# Altium schematic symbol library Connectors.SchLib: 83 symbols (continued)
## 5022442430 (continued)
CONN 24x1 FFC 0.5mm bottom SMT; Manufacturer: Molex; Number of Contacts: 24; Max Voltage Rating (AC): 50V; Current Rating: 400mA; Stackable: No; Wire/Cable Type: Straight,Flat Flex; Mating Cycles: 20; Supplier 1: Digi-Key; Manufacturer Part Number: 5022442430; Category: FFC / FPC; Stock 1: 13141; Pricing 1: 1=1.52000, 10=1.37600, 25=1.29160, 50=1.23540, 100=1.17930, 250=1.06696, 500=0.98272, 1000=0.84233 (USD); Min Operating Temperature: -25°C; Max Operating Temperature: 85°C; Orientation: Right Angle; Number of Rows: 1; Number of Positions: 24; Voltage Rating: 50V; Number of Circuits: 24; Contact Location: Bottom; Max Voltage Rating (DC): 50V; Voltage Rating (AC): 50V; Pitch: 0.5mm; ComponentLink1URL: https://datasheet.ciiva.com/673/5022441530-sd-673746.pdf?src-supplier=Digi-Key; ComponentLink1Description: https://datasheet.ciiva.com/673/5022441530-sd-673746.pdf?src-supplier=Digi-Key; Supplier Part Number 1: WM14450CT-ND
footprint MOLX-502244-2430 (FFC Connector, 24-Leads, Right Angle, Pitch 0.5 mm, Mated Height 2.33 mm, SMT)
pins: 1, 2, 3, 4, 5, 6, 7, 8, 9, 10, 11, 12, 13, 14, 15, 16, 17, 18, 19, 20, 21, 22, 23, 24, MP1, MP2, MP3, MP4

## 5031482090
designator J?
CONN RCPT 20P 0.059 TIN SMD R/A; Manufacturer: Molex; Number of Contacts: 20; Pitch: 1.5mm; Manufacturer Part Number: 5031482090; Min Operating Temperature: -55°C; Max Operating Temperature: 125°C; Number of Rows: 2; Mounting Type: Surface Mount, Right Angle; ComponentLink1URL: https://datasheet.ciiva.com/22665/shf-22665879.pdf?src-supplier=Element14; ComponentLink1Description: https://datasheet.ciiva.com/22665/shf-22665879.pdf?src-supplier=Element14; Supplier 1: Digi-Key; Supplier Part Number 1: WM9451CT-ND
pins: 1, 2, 3, 4, 5, 6, 7, 8, 9, 10, 11, 12, 13, 14, 15, 16, 17, 18, 19, 20, EP, EP

## 5034800600
designator J?
CONN 6x1 FFC 0.5mm top SMT; Manufacturer: Molex; Manufacturer Part Number: 503480-0600; Current Rating: 500mA; Voltage Rating: 50V; Number of Positions: 6; Wire/Cable Type: Straight; Stackable: No; Mating Cycles: 10; Supplier 1: Digi-Key; Category: FFC / FPC; Stock 1: 25597; Pricing 1: 1=0.74000, 10=0.64900, 25=0.61080, 50=0.58540, 100=0.56000, 250=0.50908, 500=0.45818, 1000=0.40726 (USD); Min Operating Temperature: -40°C; Max Operating Temperature: 85°C; Number of Rows: 1; Orientation: Right Angle; Number of Contacts: 6; Max Voltage Rating (AC): 50V; Max Voltage Rating (DC): 50V; Voltage Rating (AC): 50V; Number of Circuits: 6; Pitch: 0.5mm; ComponentLink1URL: https://datasheet.ciiva.com/671/5034800400-sd-671136.pdf?src-supplier=Digi-Key; ComponentLink1Description: https://datasheet.ciiva.com/671/5034800400-sd-671136.pdf?src-supplier=Digi-Key; Supplier Part Number 1: WM1387CT-ND
footprint MOLX-503480-0600 (FPC Connector, 6-Leads, Right Angle, Pitch 0.5 mm, Mated Height 1.0 mm, SMT)
pins: 1, 2, 3, 4, 5, 6, MP1, MP2

## 68610614122
designator J?
CONN 6x1 FFC 1.0mm top SMT; Manufacturer: Wurth Electronics; Number of Positions: 6; Current Rating: 1A; Voltage Rating: 125V; Pitch: 0.039inch; Supplier 1: Digi-Key; Manufacturer Part Number: 68610614122; Category: FFC / FPC; Stock 1: 5066; Pricing 1: 1=0.78000, 10=0.72100, 50=0.67000, 100=0.58000, 500=0.55400 (USD); Min Operating Temperature: -25°C; Max Operating Temperature: 85°C; Orientation: Straight; Number of Rows: 1; Number of Contacts: 6; ComponentLink1URL: https://datasheet.ciiva.com/25617/0900766b81113a8e-25617748.pdf?src-supplier=RSComponents; ComponentLink1Description: https://datasheet.ciiva.com/25617/0900766b81113a8e-25617748.pdf?src-supplier=RSComponents; Supplier Part Number 1: 732-2002-1-ND
footprint 68610614122 (ZIF Connectors, Horizontal, Top Contact, pitch 1mm, 6p)
pins: 1, 2, 3, 4, 5, 6, MP1, MP2

## 68610614122 Orientation reversed
designator J?
CONN 6x1 FFC 1.0mm top SMT orientation reversed; Manufacturer: Wurth Electronics; Number of Positions: 6; Current Rating: 1A; Voltage Rating: 125V; Pitch: 0.039inch; Supplier 1: Digi-Key; Manufacturer Part Number: 68610614122; Category: FFC / FPC; Min Operating Temperature: -25°C; Max Operating Temperature: 85°C; Orientation: Pinout reversed from drawing; Number of Rows: 1; Number of Contacts: 6; ComponentLink1URL: https://datasheet.ciiva.com/25617/0900766b81113a8e-25617748.pdf?src-supplier=RSComponents; ComponentLink1Description: https://datasheet.ciiva.com/25617/0900766b81113a8e-25617748.pdf?src-supplier=RSComponents; Supplier Part Number 1: 732-2002-1-ND
footprint 68610614122 orientation reversed (ZIF Connectors, Horizontal, Top Contact, pitch 1mm, 6p)
pins: 1, 2, 3, 4, 5, 6, MP1, MP2

## B2B-PH-K-S(LF)(SN)
designator J?
CONN 2x1 VERT keyed 2mm TH; Manufacturer: JST; Manufacturer Part Number: B2BPHKSLFSN; Number of Positions: 2; Max Voltage Rating (AC): 100V; Max Current Rating: 2A; Category: Connectors; Min Operating Temperature: -25°C; Max Operating Temperature: 85°C; Orientation: Straight; Fastening Type: Detent; Number of Contacts: 2; Working Voltage: 100V; Max Voltage Rating (DC): 100V; Number of Rows: 1; Number of Poles: 2; Current Rating: 2A; Voltage Rating: 100V; Voltage Rating (AC): 100V; Height: 9.4mm; Pitch: 2mm; Lead Pitch: 2mm; ComponentLink1URL: https://datasheet.ciiva.com/6747/80560-6747392.pdf?src-supplier=Newark; ComponentLink1Description: https://datasheet.ciiva.com/6747/80560-6747392.pdf?src-supplier=Newark; Supplier 1: Digi-Key; Supplier Part Number 1: 455-1704-ND; Supplier 2: RSComponents; Supplier Part Number 2: 8201422; Supplier 3: Future Electronics; Supplier Part Number 3: 6306179; Supplier 4: Newark; Supplier Part Number 4: 37K9940
footprint JST-B2B-PH-K-S_V (Connector, 2-Leads, Body 5.9x4.5mm, Pitch 2mm)
pins: 1 ?, 2 ?

## B4B-PH-K-S(LF)(SN)
designator J?
CONN 4x1 VERT keyed 2mm TH; Manufacturer: JST; Current Rating: 2A; Number of Contacts: 4; Max Voltage Rating (AC): 100V; Manufacturer Part Number: B4B-PH-K-S(LF)(SN); Category: Connectors; Stock 1: 30936; Pricing 1: 1=0.24000, 10=0.22700, 100=0.15730, 500=0.13312, 1000=0.10892, 5000=0.09682, 10000=0.08774 (USD); Min Operating Temperature: -25°C; Max Operating Temperature: 85°C; Fastening Type: Detent; Max Voltage Rating (DC): 100V; Working Voltage: 100V; Orientation: Straight; Number of Rows: 1; Voltage Rating: 100V; Max Current Rating: 2A; Number of Poles: 4; Voltage Rating (AC): 100V; Number of Positions: 4; Height: 9.4mm; Pitch: 2mm; Lead Pitch: 2mm; ComponentLink1URL: https://datasheet.ciiva.com/11747/0900766b8082f552-11747200.pdf?src-supplier=RSComponents; ComponentLink1Description: https://datasheet.ciiva.com/11747/0900766b8082f552-11747200.pdf?src-supplier=RSComponents; Supplier 1: Digi-Key; Supplier Part Number 1: 455-1706-ND; Supplier 2: Farnell; Supplier Part Number 2: 9492437; Supplier 3: RSComponents; Supplier Part Number 3: 8201434
footprint JST_B4B-PH-K-S(LF)(SN)
pins: 1 ?, 2 ?, 3 ?, 4 ?

## B4B-PH-SM4-TBT(LF)(SN)
designator J?
CONN HEADER SMD 4POS 2MM; Manufacturer: JST; Current Rating: 2A; Number of Poles: 4; Voltage Rating: 100V; Manufacturer Part Number: B4B-PH-SM4-TBT(LF)(SN); Colour: White,Natural; Housing Colour: Natural; Min Operating Temperature: -25°C; Max Operating Temperature: 85°C; Number of Rows: 1; Number of Positions: 4; Orientation: Right Angle; Height: 8.6mm; Pitch: 2mm; ComponentLink1URL: https://datasheet.ciiva.com/11747/0900766b8082653c-11747869.pdf; ComponentLink1Description: https://datasheet.ciiva.com/11747/0900766b8082653c-11747869.pdf; Supplier 1: Digi-Key; Supplier Part Number 1: 455-2873-1-ND
footprint B4B-PH-SM4-TBT(LF)(SN)
pins: 0 ?, 1 ?, 2 ?, 3 ?, 4 ?

## CONN 2 M20-9990245
designator J?, comment M20-9990245
CONN HEADER 2x1 pin 0.1" TH; Manufacturer: Harwin Inc.; Pitch - Mating: 0.100" (2.54mm); Number of Positions: 2; Number of Positions Loaded: All; Style: Board to Board or Cable; Shrouding: Unshrouded; Contact Length - Mating: 0.240" (6.10mm); Contact Length - Post: 0.118" (3.00mm); Overall Contact Length: 0.460" (11.68mm); Material Flammability Rating: UL94 V-0; Current Rating: 3A per Contact; Mated Stacking Heights: 10.04mm, 10.64mm, 11.04mm, 16.54mm; Supplier 1: Digi-Key; Manufacturer Part Number: M20-9990245; Category: Connectors, Interconnects; Stock 1: 32617; Pricing 1: 1=0.15, 10=0.136, 100=0.0841, 500=0.0696, 1000=0.0609, 5000=0.0522, 10000=0.05075 (USD); Contact Type: Male Pin; Number of Rows: 1; Mounting Type: Through Hole; Fastening Type: Push-Pull; Insulation Height: 0.100" (2.54mm); Contact Finish - Mating: Gold; Features: -; Operating Temperature: -40°C ~ 105°C; Insulation Color: Black; Voltage Rating: -; Applications: -; ComponentLink1URL: https://cdn.harwin.com/pdfs/M20-999.pdf; ComponentLink1Description: https://cdn.harwin.com/pdfs/M20-999.pdf; Supplier Part Number 1: 952-2261-ND
footprint CONN 0.1" SIL 2
pins: 1 ?, 2 ?

## CONN 3 M20-9990345
designator J?, comment M20-9990345
CONN HEADER 3x1 pin 0.1 TH; Manufacturer: Harwin Inc.; Pitch - Mating: 0.100" (2.54mm); Number of Positions: 3; Number of Positions Loaded: All; Style: Board to Board or Cable; Shrouding: Unshrouded; Contact Length - Mating: 0.240" (6.10mm); Contact Length - Post: 0.118" (3.00mm); Overall Contact Length: 0.460" (11.68mm); Material Flammability Rating: UL94 V-0; Current Rating: 3A per Contact; Mated Stacking Heights: 10.04mm, 10.64mm, 11.04mm, 16.54mm; Supplier 1: Digi-Key; Manufacturer Part Number: M20-9990345; Category: Connectors, Interconnects; Stock 1: 68489; Pricing 1: 1=0.18, 10=0.165, 100=0.1015, 500=0.084, 1000=0.0735, 5000=0.063, 10000=0.06125 (USD); Contact Type: Male Pin; Number of Rows: 1; Mounting Type: Through Hole; Fastening Type: Push-Pull; Insulation Height: 0.100" (2.54mm); Contact Finish - Mating: Gold; Features: -; Operating Temperature: -40°C ~ 105°C; Insulation Color: Black; Voltage Rating: -; Applications: -; ComponentLink1URL: https://cdn.harwin.com/pdfs/M20-999.pdf; ComponentLink1Description: https://cdn.harwin.com/pdfs/M20-999.pdf; Supplier Part Number 1: 952-2263-ND
footprint CONN 0.1" SIL 3
pins: 1 ?, 2 ?, 3 ?

## CONN 4 M20-9990445
designator J?, comment M20-9990445
CONN HEADER 4x1 pin 0.1 TH; Manufacturer: Harwin; Number of Contacts: 4; Current Rating: 3A; Pitch: 2.54mm; ComponentLink1URL: https://cdn.harwin.com/pdfs/M20-999.pdf; ComponentLink1Description: https://cdn.harwin.com/pdfs/M20-999.pdf; Supplier 1: Digi-Key; Manufacturer Part Number: M20-9990445; Category: Headers and Wire Housings; Stock 1: 7974; Pricing 1: 1=0.19000, 10=0.18000, 100=0.12480, 500=0.10560, 1000=0.08640, 5000=0.07680, 10000=0.06960 (USD); Case/Package: SIL; Min Operating Temperature: -40°C; Max Operating Temperature: 105°C; Number of Rows: 1; Orientation: Straight; Number of Positions: 4; Max Current Rating: 3A; Height: 0.1inch; Supplier Part Number 1: 952-2265-ND
footprint CONN 0.1" SIL 4
pins: 1 ?, 2 ?, 3 ?, 4 ?

## CONUFL001-SMD-T
designator J?
CONN UMC JACK STR SMD; Manufacturer: Linx; Connector Style: U.FL (UMCC); Connector Type: Jack, Male Pin; Impedance: 50 Ohm; Manufacturer Part Number: CONUFL001-SMD-T; Fastening Type: Snap-On; Supplier 1: Digi-Key; Supplier Part Number 1: CONUFL001-SMD-TCT-ND
footprint U.FL connector
pins: 1 ?, 2 ?, 2 ?

## CUI_TB010-508-05BE
designator J?, comment TB010-508-05BE
5 Position Wire to Board, Board 0.200" (5.08mm); Manufacturer: CUI; Manufacturer Part Number: TB010-508-05BE; Supplier 1: Digi-Key; Supplier Part Number 1: 102-6221-ND
footprint CUI_TB010-508-05BE
pins: 1, 2, 3, 4, 5

## FH12-40S-0.5SH(55)
designator J?
CONN 40x1 FFC 0.5mm bottom SMT; Manufacturer: Hirose; Manufacturer Part Number: FH12A-40S-0.5SH(55); Voltage Rating: 50V; Current Rating: 500mA; Number of Positions: 40; Mating Cycles: 20; Wire/Cable Type: Straight; Contact Location: Top; Max Current Rating: 400mA; Supplier 1: Digi-Key; Category: FFC / FPC; Stock 1: 6676; Pricing 1: 1=2.56000, 10=2.45500, 25=2.25080, 50=2.14840, 100=2.04600, 250=1.79024, 500=1.73910 (USD); Min Operating Temperature: -40°C; Max Operating Temperature: 70°C; Number of Rows: 1; Orientation: Right Angle; Number of Contacts: 40; Max Voltage Rating (AC): 50V; Voltage Rating (AC): 50V; Pitch: 0.5mm; Lead Pitch: 0.5mm; ComponentLink1URL: https://datasheet.ciiva.com/14667/0900766b80806912-14667338.pdf?src-supplier=RSComponents; ComponentLink1Description: https://datasheet.ciiva.com/14667/0900766b80806912-14667338.pdf?src-supplier=RSComponents; Supplier Part Number 1: HFK140CT-ND
footprint HIRO-FH12A-40S-0.5SH(55)_V (SMD, 40-Leads, Body 24.5x6.2mm, Pitch 0.5mm)
pins: 1, 2, 3, 4, 5, 6, 7, 8, 9, 10, 11, 12, 13, 14, 15, 16, 17, 18, 19, 20, 21, 22, 23, 24, 25, 26, 27, 28, 29, 30, 31, 32, 33, 34, 35, 36, 37, 38, 39, 40, MP1, MP2

## FTSH-110-01-L-DV
designator J?
CONN HEADER SMD 20POS 1.27MM; Manufacturer: Samtec; Number of Positions: 20; Current Rating: 3.4A; Shrouded: No; Manufacturer Part Number: FTSH-110-01-L-DV; Connector Type: Header; Min Operating Temperature: -55°C; Max Operating Temperature: 125°C; Number of Rows: 2; Orientation: Vertical; ComponentLink1URL: https://datasheet.ciiva.com/714/eng-cd-103308-m-714897.pdf?src-supplier=Digi-Key; ComponentLink1Description: https://datasheet.ciiva.com/714/eng-cd-103308-m-714897.pdf?src-supplier=Digi-Key; Supplier 1: Digi-Key; Supplier Part Number 1: SAM1161-10-ND; Supplier 2: Newark; Supplier Part Number 2: 11P4829; Pitch: 1.27mm
footprint FTSH-110-01-L-DV
pins: 1, 2, 3, 4, 5, 6, 7, 8, 9, 10, 11, 12, 13, 14, 15, 16, 17, 18, 19, 20

## FX22-50P-0.5SH
designator J?
CONN PLUG 50x1 RA 0.5MM SMD; Manufacturer: Hirose; Number of Positions: 50; Pitch: 0.02inch; Supplier 1: Digi-Key; Manufacturer Part Number: FX22-50P-0.5SH; Category: Headers and Wire Housings; Stock 1: 234; Pricing 1: 1=2.97000, 10=2.85100, 25=2.61360, 50=2.49480, 100=2.37600, 250=2.07900 (USD); Number of Rows: 1; ComponentLink1URL: https://www.hirose.com/product/en/download_file/key_name/FX22/category/Catalog/doc_file_id/49374/?file_category_id=4&item_id=205&is_series=1&src-supplier=Digi-Key; ComponentLink1Description: https://www.hirose.com/product/en/download_file/key_name/FX22/category/Catalog/doc_file_id/49374/?file_category_id=4&item_id=205&is_series=1&src-supplier=Digi-Key; Supplier Part Number 1: H122984CT-ND
footprint FX22-50P-0.5SH
pins: 1, 2, 3, 4, 5, 6, 7, 8, 9, 10, 11, 12, 13, 14, 15, 16, 17, 18, 19, 20, 21, 22, 23, 24, 25, 26, 27, 28, 29, 30, 31, 32, 33, 34, 35, 36, 37, 38, 39, 40, 41, 42, 43, 44, 45, 46, 47, 48, 49, 50, MH1, MH2, MH3, MH4

## FX22-50S-0.5SH
designator J?
CONN RCPT 50x1 RA 0.5MM SMD; Manufacturer: Hirose; Number of Positions: 50; Pitch: 0.02inch; Supplier 1: Digi-Key; Manufacturer Part Number: FX22-50S-0.5SH; Category: Headers and Wire Housings; Stock 1: 685; Pricing 1: 1=2.61000, 10=2.50800, 25=2.29920, 50=2.19460, 100=2.09000, 250=1.82876 (USD); Number of Rows: 1; ComponentLink1URL: https://www.hirose.com/product/en/download_file/key_name/FX22/category/Catalog/doc_file_id/49374/?file_category_id=4&item_id=205&is_series=1&src-supplier=Digi-Key; ComponentLink1Description: https://www.hirose.com/product/en/download_file/key_name/FX22/category/Catalog/doc_file_id/49374/?file_category_id=4&item_id=205&is_series=1&src-supplier=Digi-Key; Supplier Part Number 1: H122988CT-ND
footprint FX22-50S-0.5SH
pins: 1, 2, 3, 4, 5, 6, 7, 8, 9, 10, 11, 12, 13, 14, 15, 16, 17, 18, 19, 20, 21, 22, 23, 24, 25, 26, 27, 28, 29, 30, 31, 32, 33, 34, 35, 36, 37, 38, 39, 40, 41, 42, 43, 44, 45, 46, 47, 48, 49, 50, MH1, MH2, MH3, MH4

## KEYSTONE_7693
designator J?, comment Keystone 7693
CONN TERM screw block 15A TH; Manufacturer: Keystone Electronics; Manufacturer Part Number: 7693; Number of Contacts: 4; Supplier 1: Digi-Key; Supplier Part Number 1: 36-7693-ND; Stock 1: 79261; Pricing 1: 1=0.57, 10=0.535, 50=0.428, 100=0.4101, 250=0.37444, 500=0.3566, 1000=0.2995, 2500=0.26745, 5000=0.25854 (USD); Colour: Silver; Current Rating: 15A; Orientation: Vertical; Number of Rows: 2; Diameter: 0.31inch; Height: 0.44inch; ComponentLink1URL: https://datasheet.ciiva.com/14550/70181561-14550853.pdf; ComponentLink1Description: https://datasheet.ciiva.com/14550/70181561-14550853.pdf
footprint DIP6_C258H193_KEYSTONE_7693
pins: 1, 2, 3, 4

## MOLEX_0475890001
designator J?
CONN USB AB female micro TH; Manufacturer: Molex; Number of Contacts: 5; Number of Ports: 1; Max Voltage Rating (AC): 100V; Pitch: 0.65mm; Manufacturer Part Number: 0475890001; Stock 1: 33278; Pricing 1: 1=0.74, 10=0.649, 25=0.6108, 50=0.5854, 100=0.56, 250=0.5091, 500=0.4582 (USD); Number of Terminals: 5; Min Operating Temperature: -20°C; Max Operating Temperature: 85°C; Orientation: Right Angle; ComponentLink1URL: https://datasheet.ciiva.com/15181/getdatasheetpartid-247969-15181267.pdf; ComponentLink1Description: https://datasheet.ciiva.com/15181/getdatasheetpartid-247969-15181267.pdf; Supplier 1: Mouser; Supplier Part Number 1: 538-47589-0001; Supplier 2: Newark; Supplier Part Number 2: 40P3749
footprint MOLX-47589-0001_V (SMD, 5-Leads, Body 7.5x5.6mm, Pitch 0.65mm)
pins: 1 VCC, 2 D-, 3 D+, 4 ID, 5 GND, PAD, TH TH SHLD

## PPPC061LFBN-RC
designator J?
CONN HEADER 6x1 female 0.1" TH; Manufacturer: Sullins; Number of Positions: 6; Pitch: 0.1inch; Supplier 1: Digi-Key; Manufacturer Part Number: PPPC061LFBN-RC; Category: Connectors; Stock 1: 21128; Pricing 1: 1=0.53000, 10=0.50000, 100=0.38300, 500=0.33300, 1000=0.27473, 5000=0.24143, 10000=0.24050 (USD); Number of Rows: 1; Height: 8.5mm; ComponentLink1URL: https://media.digikey.com/pdf/Data%20Sheets/Sullins%20PDFs/Female_Headers.100_DS.pdf?src-supplier=Digi-Key; ComponentLink1Description: https://media.digikey.com/pdf/Data%20Sheets/Sullins%20PDFs/Female_Headers.100_DS.pdf?src-supplier=Digi-Key; Supplier Part Number 1: S7039-ND
footprint SLIN-PPPC061LFBN-RC_V (THD, 6-Leads)
pins: 1, 2, 3, 4, 5, 6

## PPPC081LFBN-RC
designator J?
CONN HEADER 8x1 female 0.1" TH; Manufacturer: Sullins; Number of Positions: 8; Pitch: 0.1inch; Supplier 1: Digi-Key; Manufacturer Part Number: PPPC081LFBN-RC; Category: Connectors; Stock 1: 30815; Pricing 1: 1=0.67000, 10=0.63200, 100=0.48440, 500=0.42120, 1000=0.34749, 5000=0.30537, 10000=0.30420 (USD); Number of Rows: 1; Height: 8.5mm; ComponentLink1URL: https://media.digikey.com/pdf/Data%20Sheets/Sullins%20PDFs/Female_Headers.100_DS.pdf?src-supplier=Digi-Key; ComponentLink1Description: https://media.digikey.com/pdf/Data%20Sheets/Sullins%20PDFs/Female_Headers.100_DS.pdf?src-supplier=Digi-Key; Supplier Part Number 1: S7041-ND
footprint SLIN-PPPC081LFBN-RC_V (THD, 8-Leads, Body 20.82x2.54mm, Pitch 2.54mm)
pins: 1, 2, 3, 4, 5, 6, 7, 8

## PPPC101LFBN-RC
designator J?
CONN HEADER 10x1 female 0.1" TH; Manufacturer: Sullins; Number of Positions: 10; Pitch: 0.1inch; Supplier 1: Digi-Key; Manufacturer Part Number: PPPC101LFBN-RC; Category: Connectors; Stock 1: 21587; Pricing 1: 1=0.68000, 10=0.59400, 100=0.51280, 500=0.41958, 1000=0.37296, 5000=0.33670 (USD); Number of Rows: 1; Height: 8.5mm; ComponentLink1URL: https://media.digikey.com/pdf/Data%20Sheets/Sullins%20PDFs/Female_Headers.100_DS.pdf?src-supplier=Digi-Key; ComponentLink1Description: https://media.digikey.com/pdf/Data%20Sheets/Sullins%20PDFs/Female_Headers.100_DS.pdf?src-supplier=Digi-Key; Supplier Part Number 1: S7043-ND
footprint SLIN-PPPC101LFBN-RC_V (THD, 10-Leads)
pins: 1, 2, 3, 4, 5, 6, 7, 8, 9, 10

## PPPC142LFBN-RC
designator J?  Supplier Part Number 1: S7117-ND
CONN HDR 28POS 0.1 GOLD PCB; Manufacturer: Sullins; Number of Positions: 28; Pitch: 0.1inch; Manufacturer Part Number: PPPC142LFBN-RC; Category: Connectors; Stock 1: 1723; Number of Rows: 2; Height: 8.5mm; ComponentLink1URL: https://media.digikey.com/pdf/Data%20Sheets/Sullins%20PDFs/Female_Headers.100_DS.pdf?src-supplier=Digi-Key; ComponentLink1Description: https://media.digikey.com/pdf/Data%20Sheets/Sullins%20PDFs/Female_Headers.100_DS.pdf?src-supplier=Digi-Key; Supplier 1: Digi-Key
footprint PPPC142LFBN-RC (THD, 28-Leads)
pins: 1, 2, 3, 4, 5, 6, 7, 8, 9, 10, 11, 12, 13, 14, 15, 16, 17, 18, 19, 20, 21, 22, 23, 24, 25, 26, 27, 28

## PPPC162LFBN-RC
designator J?  Supplier Part Number 1: S7119-ND
CONN HDR 32POS 0.1 GOLD PCB; Manufacturer: Sullins; Number of Positions: 32; Pitch: 0.1inch; Manufacturer Part Number: PPPC162LFBN-RC; Category: Connectors; Stock 1: 1273; Number of Rows: 2; Height: 8.5mm; ComponentLink1URL: https://media.digikey.com/pdf/Data%20Sheets/Sullins%20PDFs/Female_Headers.100_DS.pdf?src-supplier=Digi-Key; ComponentLink1Description: https://media.digikey.com/pdf/Data%20Sheets/Sullins%20PDFs/Female_Headers.100_DS.pdf?src-supplier=Digi-Key; Supplier 1: Digi-Key
footprint PPPC162LFBN-RC (THD, 32-Leads)
pins: 1, 2, 3, 4, 5, 6, 7, 8, 9, 10, 11, 12, 13, 14, 15, 16, 17, 18, 19, 20, 21, 22, 23, 24, 25, 26, 27, 28, 29, 30, 31, 32

## PR20206VBNN
designator J?
CONN HEADER 6x1 male 0.1" TH; Manufacturer: METZ CONNECT; Number of Positions: 6; Pitch: 0.1inch; Manufacturer Part Number: PR20206VBNN; Category: Connectors; Stock 1: 21128; Pricing 1: 1=0.53000, 10=0.50000, 100=0.38300, 500=0.33300, 1000=0.27473, 5000=0.24143, 10000=0.24050 (USD); Number of Rows: 1; Height: 8.5mm; Supplier 1: Digi-Key; Supplier Part Number 1: 1849-PR20206VBNN-ND
footprint PR20206VBNN (THD, 6-Leads)
pins: 1, 2, 3, 4, 5, 6

## PREC016DAAN-RC
designator J?
CONN HEADER VERT 32POS 2.54MM; Manufacturer: Sullins; Manufacturer Part Number: S2012EC-16-ND; Number of Positions: 32; Pitch: 0.1inch; Category: Connectors; Number of Rows: 2; ComponentLink1URL: https://media.digikey.com/pdf/Data%20Sheets/Sullins%20PDFs/Female_Headers.100_DS.pdf?src-supplier=Digi-Key; ComponentLink1Description: https://media.digikey.com/pdf/Data%20Sheets/Sullins%20PDFs/Female_Headers.100_DS.pdf?src-supplier=Digi-Key; Supplier 1: Digi-Key; Supplier Part Number 1: S2012EC-16-ND
footprint PPPC162LFBN-RC (THD, 32-Leads)
pins: 1, 2, 3, 4, 5, 6, 7, 8, 9, 10, 11, 12, 13, 14, 15, 16, 17, 18, 19, 20, 21, 22, 23, 24, 25, 26, 27, 28, 29, 30, 31, 32

## S2B-PH-K-S(LF)(SN)
designator J?
CONN 2x1 RA keyed 2mm TH; Manufacturer: JST; Current Rating: 2A; Voltage Rating: 100V; Number of Positions: 2; Manufacturer Part Number: S2B-PH-K-S(LF)(SN); Stock 1: 140835; Pricing 1: 1=0.17, 10=0.161, 100=0.0991, 500=0.08202, 1000=0.07177, 5000=0.06152, 10000=0.05981 (USD); Colour: Natural,White; Housing Colour: White; Min Operating Temperature: -25°C; Max Operating Temperature: 85°C; Max Current Rating: 2A; Number of Rows: 1; Fastening Type: Detent; Number of Contacts: 2; Max Voltage Rating (AC): 100V; Orientation: Right Angle; Number of Poles: 2; Voltage Rating (AC): 100V; Max Voltage Rating (DC): 100V; Working Voltage: 100V; Height: 9.4mm; Pitch: 2mm; Lead Pitch: 2mm; Supplier 1: Digi-Key; Supplier Part Number 1: 455-1719-ND; Supplier 2: Newark; Supplier Part Number 2: 38K8066; Supplier 3: Future Electronics; Supplier Part Number 3: 7754757
footprint S2B-PH-K-S(LF)(SN)
pins: 1 ?, 2 ?

## S4B-PH-K-S(LF)(SN)
designator J?
CONN 4x1 RA keyed 2mm TH; Manufacturer: JST; Current Rating: 2A; Number of Poles: 4; Voltage Rating (AC): 100V; Manufacturer Part Number: S4B-PH-K-S(LF)(SN); Stock 1: 66231; Pricing 1: 1=0.22, 10=0.208, 100=0.144, 500=0.12186, 1000=0.0997, 5000=0.08862, 10000=0.08031 (USD); Colour: White,Natural; Housing Colour: Natural; Min Operating Temperature: -25°C; Max Operating Temperature: 85°C; Number of Rows: 1; Voltage Rating: 100V; Number of Positions: 4; Fastening Type: Detent; Number of Contacts: 4; Working Voltage: 100V; Orientation: Right Angle; Height: 9.4mm; Pitch: 2mm; Lead Pitch: 2mm; ComponentLink1URL: https://datasheet.ciiva.com/11747/0900766b8082653c-11747869.pdf; ComponentLink1Description: https://datasheet.ciiva.com/11747/0900766b8082653c-11747869.pdf; Supplier 1: Digi-Key; Supplier 2: Newark; Supplier Part Number 2: 38K8074; Supplier Part Number 1: 455-1721-ND
footprint JST_S4B-PH-K-S(LF)(SN)
pins: 1 ?, 2 ?, 3 ?, 4 ?

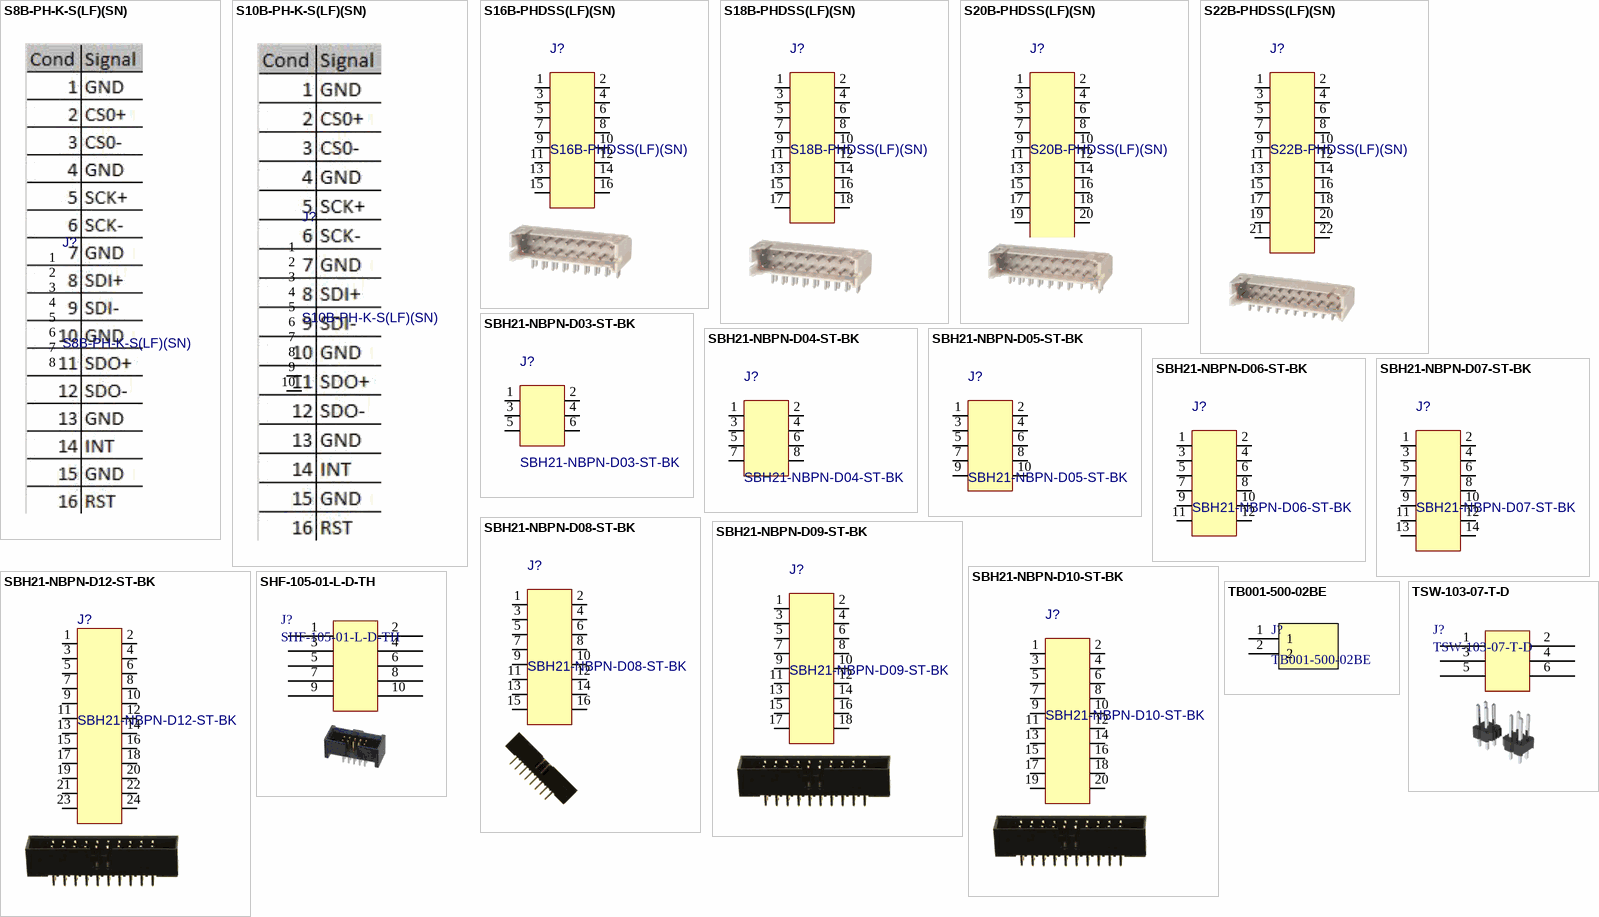
[diagram p2: symbols S8B-PH-K-S(LF)(SN) to TSW-103-07-T-D]

## S8B-PH-K-S(LF)(SN)
designator J?
CONN HEADER R/A 8POS 2MM; Manufacturer: JST; Current Rating: 2A; Number of Poles: 8; Voltage Rating: 100V; Manufacturer Part Number: S8B-PH-K-S(LF)(SN); Stock 1: 66231; Colour: White,Natural; Housing Colour: Natural; Min Operating Temperature: -25°C; Max Operating Temperature: 85°C; Number of Rows: 1; Fastening Type: Detent; Working Voltage: 100V; Orientation: Right Angle; Pitch: 2mm; Supplier 1: Newark; Supplier Part Number 1: 38K8085
footprint S8B-PH-K-S(LF)(SN)
pins: 1 ?, 2 ?, 3 ?, 4 ?, 5 ?, 6 ?, 7 ?, 8 ?

## S10B-PH-K-S(LF)(SN)
designator J?
CONN HEADER R/A 10POS 2MM; Manufacturer: JST; Current Rating: 2A; Voltage Rating: 100V; Manufacturer Part Number: S10B-PH-K-S(LF)(SN); Stock 1: 3673; Colour: White,Natural; Housing Colour: Natural; Min Operating Temperature: -25°C; Max Operating Temperature: 85°C; Number of Rows: 1; Fastening Type: Detent; Working Voltage: 100V; Orientation: Right Angle; Pitch: 2mm; Supplier 1: Digi-Key; Supplier Part Number 1: 455-1727-ND
footprint S10B-PH-K-S(LF)(SN)
pins: 1 ?, 2 ?, 3 ?, 4 ?, 5 ?, 6 ?, 7 ?, 8 ?, 9 ?, 10 ?

## S16B-PHDSS(LF)(SN)
designator J?
CONN HEADER R/A 16POS 2MM; Manufacturer: JST; Current Rating: 3A; Voltage Rating: 100V; Number of Contacts: 16; Manufacturer Part Number: S16B-PHDSS(LF)(SN); Colour: White,Natural; Housing Colour: Natural; Min Operating Temperature: -25°C; Max Operating Temperature: 85°C; Number of Rows: 2; Fastening Type: Detent; Working Voltage: 100V; Orientation: Right Angle; Pitch: 2mm; Supplier 1: Digi-Key; Supplier Part Number 1: 455-1778-ND
footprint S16B-PH-K-S(LF)(SN)
pins: 1 ?, 2 ?, 3 ?, 4 ?, 5 ?, 6 ?, 7 ?, 8 ?, 9 ?, 10 ?, 11 ?, 12 ?, 13 ?, 14 ?, 15 ?, 16 ?

## S18B-PHDSS(LF)(SN)
designator J?
CONN HEADER R/A 18POS 2MM; Manufacturer: JST; Current Rating: 3A; Voltage Rating: 100V; Number of Contacts: 18; Manufacturer Part Number: S18B-PHDSS(LF)(SN); Colour: White,Natural; Housing Colour: Natural; Min Operating Temperature: -25°C; Max Operating Temperature: 85°C; Number of Rows: 2; Fastening Type: Detent; Working Voltage: 100V; Orientation: Right Angle; Pitch: 2mm; Supplier 1: Digi-Key; Supplier Part Number 1: 455-1779-ND
footprint S18B-PH-K-S(LF)(SN)
pins: 1 ?, 2 ?, 3 ?, 4 ?, 5 ?, 6 ?, 7 ?, 8 ?, 9 ?, 10 ?, 11 ?, 12 ?, 13 ?, 14 ?, 15 ?, 16 ?, 17 ?, 18 ?

## S20B-PHDSS(LF)(SN)
designator J?
CONN HEADER R/A 20POS 2MM; Manufacturer: JST; Current Rating: 3A; Voltage Rating: 100V; Number of Contacts: 20; Manufacturer Part Number: S20B-PHDSS(LF)(SN); Colour: White,Natural; Housing Colour: Natural; Min Operating Temperature: -25°C; Max Operating Temperature: 85°C; Number of Rows: 2; Fastening Type: Detent; Working Voltage: 100V; Orientation: Right Angle; Pitch: 2mm; Supplier 1: Digi-Key; Supplier Part Number 1: 455-1780-ND
footprint S20B-PH-K-S(LF)(SN)
pins: 1 ?, 2 ?, 3 ?, 4 ?, 5 ?, 6 ?, 7 ?, 8 ?, 9 ?, 10 ?, 11 ?, 12 ?, 13 ?, 14 ?, 15 ?, 16 ?, 17 ?, 18 ?, 19 ?, 20 ?

## S22B-PHDSS(LF)(SN)
designator J?
CONN HEADER R/A 22POS 2MM; Manufacturer: JST; Current Rating: 3A; Voltage Rating: 100V; Number of Contacts: 22; Manufacturer Part Number: S22B-PHDSS(LF)(SN); Colour: White,Natural; Housing Colour: Natural; Min Operating Temperature: -25°C; Max Operating Temperature: 85°C; Number of Rows: 2; Fastening Type: Detent; Working Voltage: 100V; Orientation: Right Angle; Pitch: 2mm; Supplier 1: Digi-Key; Supplier Part Number 1: 455-1781-ND
footprint S22B-PH-K-S(LF)(SN)
pins: 1 ?, 2 ?, 3 ?, 4 ?, 5 ?, 6 ?, 7 ?, 8 ?, 9 ?, 10 ?, 11 ?, 12 ?, 13 ?, 14 ?, 15 ?, 16 ?, 17 ?, 18 ?, 19 ?, 20 ?, 21 ?, 22 ?

## SBH21-NBPN-D03-ST-BK
designator J?
CONN HEADER VERT 6POS 2MM TO IDC; Manufacturer: Sullins; Current Rating: 2A; Voltage Rating: 500VAC; Number of Contacts: 6; Manufacturer Part Number: SBH21-NBPN-D03-ST-BK; Colour: Black; Number of Rows: 2; Fastening Type: Keyed; Orientation: Straight; Pitch: 2mm; Series: SHB21; Supplier 1: Digi-Key; Supplier Part Number 1: SBH21-NBPN-D03-ST-BK-ND
footprint SBH21-NBPN-D03-ST-BK
pins: 1 ?, 2 ?, 3 ?, 4 ?, 5 ?, 6 ?

## SBH21-NBPN-D04-ST-BK
designator J?
CONN HEADER VERT 8POS 2MM TO IDC; Manufacturer: Sullins; Current Rating: 2A; Voltage Rating: 500VAC; Number of Contacts: 8; Manufacturer Part Number: SBH21-NBPN-D04-ST-BK; Colour: Black; Number of Rows: 2; Fastening Type: Keyed; Orientation: Straight; Pitch: 2mm; Series: SHB21; Supplier 1: Digi-Key; Supplier Part Number 1: SBH21-NBPN-D04-ST-BK-ND
footprint SBH21-NBPN-D04-ST-BK
pins: 1 ?, 2 ?, 3 ?, 4 ?, 5 ?, 6 ?, 7 ?, 8 ?

## SBH21-NBPN-D05-ST-BK
designator J?
CONN HEADER VERT 10POS 2MM TO IDC; Manufacturer: Sullins; Manufacturer Part Number: SBH21-NBPN-D06-ST-BK; Current Rating: 2A; Voltage Rating: 500VAC; Number of Contacts: 10; Colour: Black; Number of Rows: 2; Fastening Type: Keyed; Orientation: Straight; Pitch: 2mm; Series: SHB21; Supplier 1: Digi-Key; Supplier Part Number 1: S9018-ND
footprint SBH21-NBPN-D05-ST-BK
pins: 1 ?, 2 ?, 3 ?, 4 ?, 5 ?, 6 ?, 7 ?, 8 ?, 9 ?, 10 ?

## SBH21-NBPN-D06-ST-BK
designator J?
CONN HEADER VERT 12POS 2MM TO IDC; Manufacturer: Sullins; Current Rating: 2A; Voltage Rating: 500VAC; Number of Contacts: 12; Manufacturer Part Number: SBH21-NBPN-D06-ST-BK; Colour: Black; Number of Rows: 2; Fastening Type: Keyed; Orientation: Straight; Pitch: 2mm; Series: SHB21; Supplier 1: Digi-Key; Supplier Part Number 1: SBH21-NBPN-D06-ST-BK-ND
footprint SBH21-NBPN-D06-ST-BK
pins: 1 ?, 2 ?, 3 ?, 4 ?, 5 ?, 6 ?, 7 ?, 8 ?, 9 ?, 10 ?, 11 ?, 12 ?

## SBH21-NBPN-D07-ST-BK
designator J?
CONN HEADER VERT 14POS 2MM TO IDC; Manufacturer: Sullins; Current Rating: 2A; Voltage Rating: 500VAC; Number of Contacts: 14; Manufacturer Part Number: SBH21-NBPN-D07-ST-BK; Colour: Black; Number of Rows: 2; Fastening Type: Keyed; Orientation: Straight; Pitch: 2mm; Series: SHB21; Supplier 1: Digi-Key; Supplier Part Number 1: S9019-ND
footprint SBH21-NBPN-D07-ST-BK
pins: 1 ?, 2 ?, 3 ?, 4 ?, 5 ?, 6 ?, 7 ?, 8 ?, 9 ?, 10 ?, 11 ?, 12 ?, 13 ?, 14 ?

## SBH21-NBPN-D08-ST-BK
designator J?
CONN HEADER VERT 16POS 2MM TO IDC; Manufacturer: Sullins; Current Rating: 2A; Voltage Rating: 500VAC; Number of Contacts: 16; Manufacturer Part Number: SBH21-NBPN-D08-ST-BK; Colour: Black; Number of Rows: 2; Fastening Type: Keyed; Orientation: Straight; Pitch: 2mm; Series: SHB21; Supplier 1: Digi-Key; Supplier Part Number 1: S9020-ND
footprint SBH21-NBPN-D08-ST-BK
pins: 1 ?, 2 ?, 3 ?, 4 ?, 5 ?, 6 ?, 7 ?, 8 ?, 9 ?, 10 ?, 11 ?, 12 ?, 13 ?, 14 ?, 15 ?, 16 ?

## SBH21-NBPN-D09-ST-BK
designator J?
CONN HEADER VERT 18POS 2MM TO IDC; Manufacturer: Sullins; Current Rating: 2A; Voltage Rating: 500VAC; Number of Contacts: 18; Manufacturer Part Number: SBH21-NBPN-D09-ST-BK; Colour: Black; Number of Rows: 2; Fastening Type: Keyed; Orientation: Straight; Pitch: 2mm; Series: SHB21; Supplier 1: Digi-Key; Supplier Part Number 1: SBH21-NBPN-D09-ST-BK-ND
footprint SBH21-NBPN-D09-ST-BK
pins: 1 ?, 2 ?, 3 ?, 4 ?, 5 ?, 6 ?, 7 ?, 8 ?, 9 ?, 10 ?, 11 ?, 12 ?, 13 ?, 14 ?, 15 ?, 16 ?, 17 ?, 18 ?

## SBH21-NBPN-D10-ST-BK
designator J?
CONN HEADER VERT 20POS 2MM TO IDC; Manufacturer: Sullins; Current Rating: 2A; Voltage Rating: 500VAC; Number of Contacts: 20; Manufacturer Part Number: SBH21-NBPN-D10-ST-BK; Colour: Black; Number of Rows: 2; Fastening Type: Keyed; Orientation: Straight; Pitch: 2mm; Series: SHB21; Supplier 1: Digi-Key; Supplier Part Number 1: S9021-ND
footprint SBH21-NBPN-D10-ST-BK
pins: 1 ?, 2 ?, 3 ?, 4 ?, 5 ?, 6 ?, 7 ?, 8 ?, 9 ?, 10 ?, 11 ?, 12 ?, 13 ?, 14 ?, 15 ?, 16 ?, 17 ?, 18 ?, 19 ?, 20 ?

## SBH21-NBPN-D12-ST-BK
designator J?
CONN HEADER VERT 24POS 2MM; Manufacturer: Sullins; Current Rating: 2A; Voltage Rating: 500VAC; Number of Contacts: 24; Manufacturer Part Number: SBH21-NBPN-D12-ST-BK; Colour: Black; Number of Rows: 2; Fastening Type: Keyed; Orientation: Straight; Pitch: 2mm; Series: SHB21; Supplier 1: Digi-Key; Supplier Part Number 1: S9021-ND
footprint SBH21-NBPN-D12-ST-BK
pins: 1 ?, 2 ?, 3 ?, 4 ?, 5 ?, 6 ?, 7 ?, 8 ?, 9 ?, 10 ?, 11 ?, 12 ?, 13 ?, 14 ?, 15 ?, 16 ?, 17 ?, 18 ?, 19 ?, 20 ?, 21 ?, 22 ?, 23 ?, 24 ?

## SHF-105-01-L-D-TH
designator J?
CONN RCPT 5x2 VERT 0.05" TH; Manufacturer: Samtec; Number of Contacts: 10; Pitch: 1.27mm; Supplier 1: Digi-Key; Manufacturer Part Number: SHF-105-01-L-D-TH; Category: Headers and Wire Housings; Stock 1: 2279; Pricing 1: 1=2.70000, 10=2.59200, 100=2.16000, 500=1.83600, 1000=1.56600, 5000=1.40400 (USD); Min Operating Temperature: -55°C; Max Operating Temperature: 125°C; Number of Rows: 2; Orientation: Straight; ComponentLink1URL: https://datasheet.ciiva.com/22665/shf-22665879.pdf?src-supplier=Element14; ComponentLink1Description: https://datasheet.ciiva.com/22665/shf-22665879.pdf?src-supplier=Element14; Supplier Part Number 1: SAM10711-ND
footprint FP-SHF-105-01-L-D-TH-MFG
pins: 1, 2, 3, 4, 5, 6, 7, 8, 9, 10

## TB001-500-02BE
designator J?
2 Position Wire to Board, 5.0mm Pitch; Manufacturer: CUI; Manufacturer Part Number: TB001-500-02BE; Supplier 1: Digi-Key; Supplier Part Number 1: 102-6134-ND
footprint CUI_TB001-500-02BE
pins: 1, 2

## TSW-103-07-T-D
designator J?
CONN HEADER VERT 6POS 2.54MM; Manufacturer: Samtec; Number of Contacts: 6; Manufacturer Part Number: TSW-103-07-T-D; Category: Headers and Wire Housings; Min Operating Temperature: -55°C; Max Operating Temperature: 125°C; Number of Rows: 2; Orientation: Straight; Pitch: 2.54mm; ComponentLink1URL: https://datasheet.ciiva.com/22665/shf-22665879.pdf?src-supplier=Element14; ComponentLink1Description: https://datasheet.ciiva.com/22665/shf-22665879.pdf?src-supplier=Element14; Supplier 1: Digi-Key; Supplier Part Number 1: MTSW-103-07-T-D-244-ND
footprint 6pos 2.54mm
pins: 1, 2, 3, 4, 5, 6